# Altium schematic symbol library FPGA_Xilinx_Virtex7.SchLib: 34 symbols (part 23 of 26)
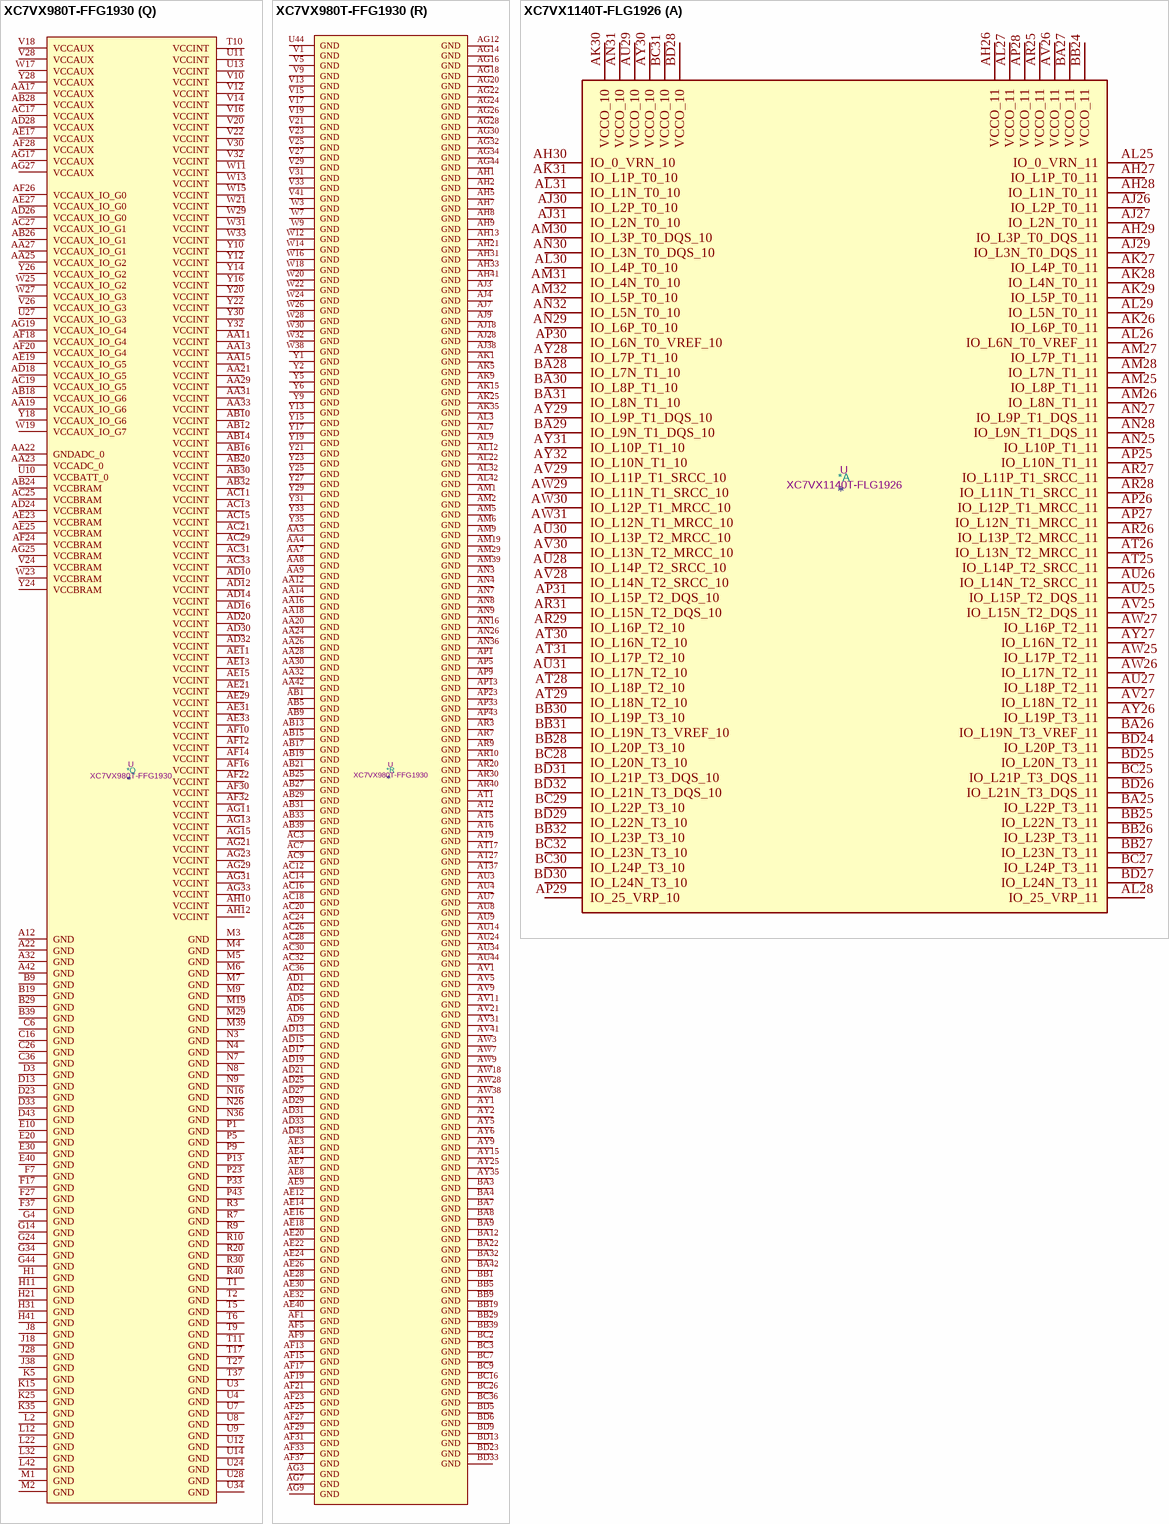
[diagram p194: symbols XC7VX980T-FFG1930 to XC7VX1140T-FLG1926]

## XC7VX980T-FFG1930
designator *  value XC7VX980T-FFG1930  Reference: U
ki_keywords: FPGA; ki_description: Virtex 7 XT 980 XC7VX980T-FFG1930
part A pins: AH29 IO_L4P_T0_10, AH30 IO_L4N_T0_10, AJ29 IO_0_VRN_10, AJ30 IO_L1P_T0_10, AJ31 IO_L1N_T0_10, AK29 IO_L2P_T0_10, AK30 VCCO_10, AK31 IO_L5P_T0_10, AL29 IO_L2N_T0_10, AL30 IO_L3P_T0_DQS_10, AL31 IO_L5N_T0_10, AM30 IO_L3N_T0_DQS_10, AM31 IO_25_VRP_10, AN29 IO_L6P_T0_10, AN30 IO_L6N_T0_VREF_10, AN31 VCCO_10, AP29 IO_L8P_T1_10, AP30 IO_L8N_T1_10, AP31 IO_L7P_T1_10, AR29 IO_L10P_T1_10, AR31 IO_L7N_T1_10, AT29 IO_L10N_T1_10, AT30 IO_L9P_T1_DQS_10, AT31 IO_L9N_T1_DQS_10, AU29 VCCO_10, AU30 IO_L11P_T1_SRCC_10, AU31 IO_L11N_T1_SRCC_10, AV29 IO_L12P_T1_MRCC_10, AV30 IO_L12N_T1_MRCC_10, AV32 IO_L13P_T2_MRCC_10, AW29 IO_L15P_T2_DQS_10, AW30 IO_L14P_T2_SRCC_10, AW31 IO_L14N_T2_SRCC_10, AW32 IO_L13N_T2_MRCC_10, AW33 VCCO_10, AW34 IO_0_VRN_11, AW41 IO_L7P_T1_11, AW42 IO_L6P_T0_11, AW43 VCCO_11, AW44 IO_L1P_T0_11, AY29 IO_L15N_T2_DQS_10, AY30 VCCO_10, AY31 IO_L16P_T2_10, AY32 IO_L16N_T2_10, AY33 IO_L24P_T3_11, AY34 IO_25_VRP_11, AY36 IO_L18P_T2_11, AY37 IO_L16P_T2_11, AY38 IO_L16N_T2_11, AY39 IO_L11P_T1_SRCC_11, AY40 VCCO_11, AY41 IO_L7N_T1_11, AY42 IO_L6N_T0_VREF_11, AY43 IO_L3P_T0_DQS_11, AY44 IO_L1N_T0_11, BA28 IO_L17P_T2_10, BA29 IO_L17N_T2_10, BA30 IO_L18P_T2_10, BA31 IO_L18N_T2_10, BA33 IO_L24N_T3_11, BA34 IO_L19P_T3_11, BA35 IO_L19N_T3_VREF_11, BA36 IO_L18N_T2_11, BA37 VCCO_11, BA38 IO_L13P_T2_MRCC_11, BA39 IO_L11N_T1_SRCC_11, BA40 IO_L9P_T1_DQS_11, BA41 IO_L9N_T1_DQS_11, BA43 IO_L5P_T0_11, BA44 IO_L3N_T0_DQS_11, BB28 IO_L24P_T3_10, BB30 IO_L22P_T3_10, BB31 IO_L19P_T3_10, BB32 IO_L19N_T3_VREF_10, BB33 IO_L22P_T3_11, BB34 VCCO_11, BB35 IO_L23P_T3_11, BB36 IO_L15P_T2_DQS_11, BB37 IO_L15N_T2_DQS_11, BB38 IO_L13N_T2_MRCC_11, BB40 IO_L8P_T1_11, BB41 IO_L8N_T1_11, BB42 IO_L4P_T0_11, BB43 IO_L5N_T0_11, BB44 VCCO_11, BC28 IO_L24N_T3_10, BC29 IO_L23P_T3_10, BC30 IO_L22N_T3_10, BC31 VCCO_10, BC32 IO_L20P_T3_10, BC33 IO_L22N_T3_11, BC34 IO_L20P_T3_11, BC35 IO_L23N_T3_11, BC37 IO_L17P_T2_11, BC38 IO_L14P_T2_SRCC_11, BC39 IO_L12P_T1_MRCC_11, BC40 IO_L10P_T1_11, BC41 VCCO_11, BC42 IO_L2P_T0_11, BC43 IO_L4N_T0_11, BD29 IO_L23N_T3_10, BD30 IO_L21P_T3_DQS_10, BD31 IO_L21N_T3_DQS_10, BD32 IO_L20N_T3_10, BD34 IO_L20N_T3_11, BD35 IO_L21P_T3_DQS_11, BD36 IO_L21N_T3_DQS_11, BD37 IO_L17N_T2_11, BD38 VCCO_11, BD39 IO_L14N_T2_SRCC_11, BD40 IO_L12N_T1_MRCC_11, BD41 IO_L10N_T1_11, BD42 IO_L2N_T0_11
part B pins: AH26 VCCO_12, AH27 IO_L2P_T0_12, AH28 IO_0_VRN_12, AJ25 IO_L3P_T0_DQS_12, AJ26 IO_L3N_T0_DQS_12, AJ27 IO_L2N_T0_12, AK26 IO_L4P_T0_12, AK27 IO_L4N_T0_12, AK28 IO_L1P_T0_12, AL25 IO_L5P_T0_12, AL26 IO_L6P_T0_12, AL27 VCCO_12, AL28 IO_L1N_T0_12, AM25 IO_L5N_T0_12, AM26 IO_L6N_T0_VREF_12, AM27 IO_25_VRP_12, AM28 IO_L7P_T1_12, AN25 IO_L8P_T1_12, AN27 IO_L9P_T1_DQS_12, AN28 IO_L7N_T1_12, AP25 IO_L8N_T1_12, AP26 IO_L10P_T1_12, AP27 IO_L9N_T1_DQS_12, AP28 VCCO_12, AP32 IO_L24P_T3_13, AP34 IO_L21P_T3_DQS_13, AP35 IO_0_VRN_13, AP36 IO_L15P_T2_DQS_13, AP38 VCCO_13, AR25 VCCO_12, AR26 IO_L10N_T1_12, AR27 IO_L11P_T1_SRCC_12, AR28 IO_L11N_T1_SRCC_12, AR32 IO_L24N_T3_13, AR33 IO_L23P_T3_13, AR34 IO_L21N_T3_DQS_13, AR35 VCCO_13, AR36 IO_L17P_T2_13, AR37 IO_L15N_T2_DQS_13, AR38 IO_L12P_T1_MRCC_13, AR39 IO_L7P_T1_13, AR41 IO_L6P_T0_13, AR42 IO_L5P_T0_13, AR43 IO_L5N_T0_13, AR44 IO_L1P_T0_13, AT25 IO_L12P_T1_MRCC_12, AT26 IO_L12N_T1_MRCC_12, AT28 IO_L13P_T2_MRCC_12, AT32 VCCO_13, AT33 IO_L23N_T3_13, AT34 IO_L19P_T3_13, AT35 IO_L19N_T3_VREF_13, AT36 IO_L17N_T2_13, AT38 IO_L11P_T1_SRCC_13, AT39 IO_L12N_T1_MRCC_13, AT40 IO_L7N_T1_13, AT41 IO_L6N_T0_VREF_13, AT42 VCCO_13, AT43 IO_L3P_T0_DQS_13, AT44 IO_L1N_T0_13, AU25 IO_L15P_T2_DQS_12, AU26 IO_L14P_T2_SRCC_12, AU27 IO_L14N_T2_SRCC_12, AU28 IO_L13N_T2_MRCC_12, AU32 IO_L20P_T3_13, AU33 IO_L20N_T3_13, AU35 IO_25_VRP_13, AU36 IO_L13P_T2_MRCC_13, AU37 IO_L13N_T2_MRCC_13, AU38 IO_L11N_T1_SRCC_13, AU39 VCCO_13, AU40 IO_L9P_T1_DQS_13, AU41 IO_L9N_T1_DQS_13, AU42 IO_L4P_T0_13, AU43 IO_L3N_T0_DQS_13, AV25 IO_L15N_T2_DQS_12, AV26 VCCO_12, AV27 IO_L18P_T2_12, AV28 IO_L18N_T2_12, AV33 IO_L22P_T3_13, AV34 IO_L22N_T3_13, AV35 IO_L16P_T2_13, AV36 VCCO_13, AV37 IO_L14P_T2_SRCC_13, AV38 IO_L14N_T2_SRCC_13, AV39 IO_L10P_T1_13, AV40 IO_L8P_T1_13, AV42 IO_L4N_T0_13, AV43 IO_L2P_T0_13, AV44 IO_L2N_T0_13, AW25 IO_L17P_T2_12, AW26 IO_L16P_T2_12, AW27 IO_L16N_T2_12, AW35 IO_L16N_T2_13, AW36 IO_L18P_T2_13, AW37 IO_L18N_T2_13, AW39 IO_L10N_T1_13, AW40 IO_L8N_T1_13, AY26 IO_L17N_T2_12, AY27 IO_L19P_T3_12, AY28 IO_L19N_T3_VREF_12, BA25 IO_L21P_T3_DQS_12, BA26 IO_L21N_T3_DQS_12, BA27 VCCO_12, BB25 IO_L20P_T3_12, BB26 IO_L20N_T3_12, BB27 IO_L22P_T3_12, BC25 IO_L23P_T3_12, BC27 IO_L22N_T3_12, BD25 IO_L23N_T3_12, BD26 IO_L24P_T3_12, BD27 IO_L24N_T3_12, BD28 VCCO_12
part C pins: AH22 IO_L2P_T0_D02_14, AH23 IO_L2N_T0_D03_14, AH24 IO_L1P_T0_D00_MOSI_14, AH25 IO_L1N_T0_D01_DIN_14, AH32 IO_L21P_T3_DQS_15, AJ21 IO_0_VRN_14, AJ22 IO_L6P_T0_FCS_B_14, AJ23 VCCO_14, AJ24 IO_L5P_T0_D06_14, AJ32 IO_L21N_T3_DQS_A18_15, AJ33 VCCO_15, AJ34 IO_L19P_T3_A22_15, AJ35 IO_0_VRN_15, AJ36 IO_L13P_T2_MRCC_15, AK21 IO_L4P_T0_D04_14, AK22 IO_L6N_T0_D08_VREF_14, AK23 IO_L3P_T0_DQS_PUDC_B_14, AK24 IO_L5N_T0_D07_14, AK32 IO_L20P_T3_A20_15, AK33 IO_L20N_T3_A19_15, AK34 IO_L19N_T3_A21_VREF_15, AK36 IO_L16P_T2_A28_15, AK37 IO_L13N_T2_MRCC_15, AK38 IO_L11P_T1_SRCC_15, AK39 IO_L9P_T1_DQS_AD3P_15, AK40 VCCO_15, AK41 IO_L6P_T0_15, AL21 IO_L4N_T0_D05_14, AL23 IO_L3N_T0_DQS_EMCCLK_14, AL24 IO_25_VRP_14, AL33 IO_L23P_T3_FOE_B_15, AL34 IO_L23N_T3_FWE_B_15, AL35 IO_L18P_T2_A24_15, AL36 IO_L16N_T2_A27_15, AL37 VCCO_15, AL38 IO_L11N_T1_SRCC_15, AL39 IO_L9N_T1_DQS_AD3N_15, AL40 IO_L7P_T1_AD2P_15, AL41 IO_L6N_T0_VREF_15, AL43 IO_L1P_T0_AD0P_15, AL44 IO_L1N_T0_AD0N_15, AM21 IO_L8P_T1_D11_14, AM22 IO_L8N_T1_D12_14, AM23 IO_L7P_T1_D09_14, AM24 VCCO_14, AM32 IO_L22P_T3_A17_15, AM33 IO_L22N_T3_A16_15, AM34 VCCO_15, AM35 IO_L17P_T2_A26_15, AM36 IO_L18N_T2_A23_15, AM37 IO_L14P_T2_SRCC_15, AM38 IO_L14N_T2_SRCC_15, AM40 IO_L7N_T1_AD2N_15, AM41 IO_L2P_T0_AD8P_15, AM42 IO_L2N_T0_AD8N_15, AM43 IO_L5P_T0_AD9P_15, AM44 VCCO_15, AN21 VCCO_14, AN22 IO_L10P_T1_D14_14, AN23 IO_L7N_T1_D10_14, AN24 IO_L9P_T1_DQS_14, AN32 IO_25_VRP_15, AN33 IO_L24P_T3_RS1_15, AN34 IO_L24N_T3_RS0_15, AN35 IO_L17N_T2_A25_15, AN37 IO_L15P_T2_DQS_15, AN38 IO_L12P_T1_MRCC_15, AN39 IO_L12N_T1_MRCC_15, AN40 IO_L8P_T1_AD10P_15, AN41 VCCO_15, AN42 IO_L4P_T0_15, AN43 IO_L5N_T0_AD9N_15, AN44 IO_L3P_T0_DQS_AD1P_15, AP21 IO_L12P_T1_MRCC_14, AP22 IO_L10N_T1_D15_14, AP24 IO_L9N_T1_DQS_D13_14, AP37 IO_L15N_T2_DQS_ADV_B_15, AP39 IO_L10P_T1_AD11P_15, AP40 IO_L10N_T1_AD11N_15, AP41 IO_L8N_T1_AD10N_15, AP42 IO_L4N_T0_15, AP44 IO_L3N_T0_DQS_AD1N_15, AR21 IO_L13P_T2_MRCC_14, AR22 IO_L12N_T1_MRCC_14, AR23 IO_L11P_T1_SRCC_14, AR24 IO_L11N_T1_SRCC_14, AT21 IO_L13N_T2_MRCC_14, AT22 VCCO_14, AT23 IO_L14P_T2_SRCC_14, AT24 IO_L14N_T2_SRCC_14, AU21 IO_L15P_T2_DQS_RDWR_B_14, AU22 IO_L15N_T2_DQS_DOUT_CSO_B_14, AU23 IO_L16P_T2_CSI_B_14, AV22 IO_L17P_T2_A14_D30_14, AV23 IO_L16N_T2_A15_D31_14, AV24 IO_L18P_T2_A12_D28_14, AW22 IO_L17N_T2_A13_D29_14, AW23 VCCO_14, AW24 IO_L18N_T2_A11_D27_14, AY22 IO_L19P_T3_A10_D26_14, AY23 IO_L19N_T3_A09_D25_VREF_14, AY24 IO_L20P_T3_A08_D24_14, BA23 IO_L22P_T3_A05_D21_14, BA24 IO_L20N_T3_A07_D23_14, BB22 IO_L23P_T3_A03_D19_14, BB23 IO_L22N_T3_A04_D20_14, BB24 VCCO_14, BC22 IO_L21P_T3_DQS_14, BC23 IO_L23N_T3_A02_D18_14, BC24 IO_L24P_T3_A01_D17_14, BD22 IO_L21N_T3_DQS_A06_D22_14, BD24 IO_L24N_T3_A00_D16_14
part D pins: AA34 IO_L22P_T3_17, AA35 IO_L21N_T3_DQS_17, AA36 IO_L19P_T3_17, AA37 VCCO_17, AA38 IO_L15N_T2_DQS_17, AA39 IO_L14P_T2_SRCC_17, AA40 IO_L14N_T2_SRCC_17, AA41 IO_L9N_T1_DQS_17, AA43 IO_L1P_T0_17, AA44 IO_L1N_T0_17, AB34 VCCO_17, AB35 IO_L21P_T3_DQS_17, AB36 IO_L23P_T3_17, AB37 IO_L23N_T3_17, AB38 IO_L15P_T2_DQS_17, AB40 IO_L12N_T1_MRCC_17, AB41 IO_L9P_T1_DQS_17, AB42 IO_L8N_T1_17, AB43 IO_L5N_T0_17, AB44 VCCO_17, AC34 IO_L24P_T3_17, AC35 IO_L24N_T3_17, AC37 IO_25_VRP_17, AC38 IO_L17P_T2_17, AC39 IO_L17N_T2_17, AC40 IO_L12P_T1_MRCC_17, AC41 VCCO_17, AC42 IO_L8P_T1_17, AC43 IO_L5P_T0_17, AC44 IO_L3N_T0_DQS_17, AD34 IO_L20P_T3_16, AD35 IO_L20N_T3_16, AD36 IO_L19P_T3_16, AD37 IO_0_VRN_16, AD38 VCCO_16, AD39 IO_L7P_T1_16, AD40 IO_L7N_T1_16, AD41 IO_L10P_T1_17, AD42 IO_L10N_T1_17, AD44 IO_L3P_T0_DQS_17, AE34 IO_L21P_T3_DQS_16, AE35 VCCO_16, AE36 IO_L22P_T3_16, AE37 IO_L19N_T3_VREF_16, AE38 IO_L16P_T2_16, AE39 IO_L16N_T2_16, AE41 IO_L9P_T1_DQS_16, AE42 IO_L9N_T1_DQS_16, AE43 IO_L5P_T0_16, AE44 IO_L3P_T0_DQS_16, AF34 IO_L21N_T3_DQS_16, AF35 IO_L23P_T3_16, AF36 IO_L22N_T3_16, AF38 IO_L18P_T2_16, AF39 IO_L13P_T2_MRCC_16, AF40 IO_L13N_T2_MRCC_16, AF41 IO_L8P_T1_16, AF42 VCCO_16, AF43 IO_L5N_T0_16, AF44 IO_L3N_T0_DQS_16, AG35 IO_L24P_T3_16, AG36 IO_L23N_T3_16, AG37 IO_L15P_T2_DQS_16, AG38 IO_L18N_T2_16, AG39 VCCO_16, AG40 IO_L11P_T1_SRCC_16, AG41 IO_L8N_T1_16, AG42 IO_L10P_T1_16, AG43 IO_L2P_T0_16, AH34 IO_25_VRP_16, AH35 IO_L24N_T3_16, AH36 VCCO_16, AH37 IO_L17P_T2_16, AH38 IO_L15N_T2_DQS_16, AH39 IO_L14P_T2_SRCC_16, AH40 IO_L11N_T1_SRCC_16, AH42 IO_L10N_T1_16, AH43 IO_L2N_T0_16, AH44 IO_L1P_T0_16, AJ37 IO_L17N_T2_16, AJ39 IO_L14N_T2_SRCC_16, AJ40 IO_L12P_T1_MRCC_16, AJ41 IO_L12N_T1_MRCC_16, AJ42 IO_L6P_T0_16, AJ43 VCCO_16, AJ44 IO_L1N_T0_16, AK42 IO_L6N_T0_VREF_16, AK43 IO_L4P_T0_16, AK44 IO_L4N_T0_16, V42 IO_L7N_T1_17, V43 IO_L2P_T0_17, V44 IO_L2N_T0_17, W34 IO_L20P_T3_17, W35 IO_L20N_T3_17, W36 IO_0_VRN_17, W37 IO_L16N_T2_17, W39 IO_L18N_T2_17, W40 IO_L13N_T2_MRCC_17, W41 IO_L11N_T1_SRCC_17, W42 IO_L7P_T1_17, W43 VCCO_17, W44 IO_L4N_T0_17, Y34 IO_L22N_T3_17, Y36 IO_L19N_T3_VREF_17, Y37 IO_L16P_T2_17, Y38 IO_L18P_T2_17, Y39 IO_L13P_T2_MRCC_17, Y40 VCCO_17, Y41 IO_L11P_T1_SRCC_17, Y42 IO_L6P_T0_17, Y43 IO_L6N_T0_VREF_17, Y44 IO_L4P_T0_17
part E pins: K40 VCCO_19, L37 VCCO_19, M34 VCCO_19, M44 VCCO_19, N31 VCCO_19, N41 VCCO_19, P35 IO_0_VRN_18, P36 IO_L8N_T1_18, P37 IO_L12N_T1_MRCC_18, P38 VCCO_18, P39 IO_L15P_T2_DQS_18, P40 IO_L15N_T2_DQS_18, P41 IO_L21P_T3_DQS_18, P42 IO_L21N_T3_DQS_18, P44 IO_L24N_T3_18, R31 IO_L2P_T0_18, R32 IO_L2N_T0_18, R33 IO_L4P_T0_18, R34 IO_L4N_T0_18, R35 VCCO_18, R36 IO_L8P_T1_18, R37 IO_L12P_T1_MRCC_18, R38 IO_L14P_T2_SRCC_18, R39 IO_L14N_T2_SRCC_18, R41 IO_L19N_T3_VREF_18, R42 IO_L23P_T3_18, R43 IO_L23N_T3_18, R44 IO_L24P_T3_18, T30 IO_L1P_T0_18, T31 IO_L1N_T0_18, T32 VCCO_18, T33 IO_L6P_T0_18, T34 IO_L6N_T0_VREF_18, T35 IO_L10P_T1_18, T36 IO_L10N_T1_18, T38 IO_L13N_T2_MRCC_18, T39 IO_L17P_T2_18, T40 IO_L17N_T2_18, T41 IO_L19P_T3_18, T42 VCCO_18, T43 IO_L22P_T3_18, T44 IO_L22N_T3_18, U30 IO_L3P_T0_DQS_18, U31 IO_L3N_T0_DQS_18, U32 IO_L5P_T0_18, U33 IO_L5N_T0_18, U35 IO_L9N_T1_DQS_18, U36 IO_L7P_T1_18, U37 IO_L7N_T1_18, U38 IO_L13P_T2_MRCC_18, U39 VCCO_18, U40 IO_L18P_T2_18, U41 IO_L18N_T2_18, U42 IO_L20P_T3_18, U43 IO_L20N_T3_18, V34 IO_25_VRP_18, V35 IO_L9P_T1_DQS_18, V36 VCCO_18, V37 IO_L11P_T1_SRCC_18, V38 IO_L11N_T1_SRCC_18, V39 IO_L16P_T2_18, V40 IO_L16N_T2_18
part F pins: A37 VCCO_21, B34 VCCO_21, C31 VCCO_21, C41 VCCO_21, D38 VCCO_21, E35 VCCO_20, F32 VCCO_20, F42 VCCO_21, G39 VCCO_20, H36 VCCO_20, J33 VCCO_20, J43 VCCO_20
part G pins: AH14 IO_0_VRN_31, AH15 IO_L4P_T0_31, AH16 VCCO_31, AH17 IO_25_VRP_30, AH18 IO_0_VRN_30, AH19 IO_L3P_T0_DQS_30, AH20 IO_L5P_T0_30, AJ14 IO_L1P_T0_31, AJ15 IO_L4N_T0_31, AJ16 IO_L2P_T0_31, AJ17 IO_L1P_T0_30, AJ19 IO_L3N_T0_DQS_30, AJ20 IO_L5N_T0_30, AK14 IO_L1N_T0_31, AK16 IO_L2N_T0_31, AK17 IO_L1N_T0_30, AK18 IO_L2P_T0_30, AK19 IO_L4P_T0_30, AK20 VCCO_30, AL14 IO_L3N_T0_DQS_31, AL15 IO_L3P_T0_DQS_31, AL16 IO_L5P_T0_31, AL17 VCCO_30, AL18 IO_L2N_T0_30, AL19 IO_L4N_T0_30, AL20 IO_L6P_T0_30, AM14 VCCO_31, AM15 IO_L6P_T0_31, AM16 IO_L5N_T0_31, AM17 IO_25_VRP_31, AM18 IO_L7P_T1_30, AM20 IO_L6N_T0_VREF_30, AN15 IO_L6N_T0_VREF_31, AN17 IO_L7N_T1_30, AN18 IO_L8N_T1_30, AN19 IO_L8P_T1_30, AN20 IO_L10P_T1_30, AP14 IO_L8N_T1_31, AP15 IO_L8P_T1_31, AP16 IO_L10P_T1_31, AP17 IO_L7P_T1_31, AP18 VCCO_30, AP19 IO_L9P_T1_DQS_30, AP20 IO_L10N_T1_30, AR14 IO_L9P_T1_DQS_31, AR15 VCCO_31, AR16 IO_L10N_T1_31, AR17 IO_L7N_T1_31, AR18 IO_L9N_T1_DQS_30, AR19 IO_L12P_T1_MRCC_30, AT14 IO_L9N_T1_DQS_31, AT15 IO_L11P_T1_SRCC_31, AT16 IO_L12P_T1_MRCC_31, AT18 IO_L12N_T1_MRCC_30, AT19 IO_L11N_T1_SRCC_30, AT20 IO_L11P_T1_SRCC_30, AU15 IO_L11N_T1_SRCC_31, AU16 IO_L12N_T1_MRCC_31, AU17 IO_L14P_T2_SRCC_31, AU18 IO_L14P_T2_SRCC_30, AU19 VCCO_30, AU20 IO_L13P_T2_MRCC_30, AV14 IO_L13N_T2_MRCC_31, AV15 IO_L13P_T2_MRCC_31, AV16 VCCO_31, AV17 IO_L14N_T2_SRCC_31, AV18 IO_L14N_T2_SRCC_30, AV19 IO_L15P_T2_DQS_30, AV20 IO_L13N_T2_MRCC_30, AW14 IO_L15P_T2_DQS_31, AW15 IO_L17N_T2_31, AW16 IO_L17P_T2_31, AW17 IO_L18P_T2_31, AW19 IO_L15N_T2_DQS_30, AW20 IO_L18P_T2_30, AW21 IO_L16P_T2_30, AY14 IO_L15N_T2_DQS_31, AY16 IO_L16P_T2_31, AY17 IO_L18N_T2_31, AY18 IO_L17P_T2_30, AY19 IO_L18N_T2_30, AY20 VCCO_30, AY21 IO_L16N_T2_30, BA14 IO_L19N_T3_VREF_31, BA15 IO_L19P_T3_31, BA16 IO_L16N_T2_31, BA17 VCCO_31, BA18 IO_L17N_T2_30, BA19 IO_L19N_T3_VREF_30, BA20 IO_L19P_T3_30, BA21 IO_L20P_T3_30, BB14 VCCO_31, BB15 IO_L20N_T3_31, BB16 IO_L20P_T3_31, BB17 IO_L23P_T3_31, BB18 IO_L23P_T3_30, BB20 IO_L22P_T3_30, BB21 IO_L20N_T3_30, BC14 IO_L22N_T3_31, BC15 IO_L22P_T3_31, BC17 IO_L23N_T3_31, BC18 IO_L23N_T3_30, BC19 IO_L21P_T3_DQS_30, BC20 IO_L22N_T3_30, BC21 VCCO_30, BD14 IO_L21N_T3_DQS_31, BD15 IO_L21P_T3_DQS_31, BD16 IO_L24N_T3_31, BD17 IO_L24P_T3_31, BD18 VCCO_30, BD19 IO_L21N_T3_DQS_30, BD20 IO_L24N_T3_30, BD21 IO_L24P_T3_30
part H pins: A27 VCCO_33, A28 IO_L20P_T3_33, A29 IO_L20N_T3_33, A30 IO_L24N_T3_33, AJ12 IO_L1P_T0_32, AJ13 VCCO_32, AK11 IO_0_VRN_32, AK12 IO_L1N_T0_32, AK13 IO_L2P_T0_32, AL10 IO_L4N_T0_32, AL11 IO_L4P_T0_32, AL13 IO_L2N_T0_32, AM10 IO_L6N_T0_VREF_32, AM11 IO_L6P_T0_32, AM12 IO_L3P_T0_DQS_32, AM13 IO_L5P_T0_32, AN10 IO_L8P_T1_32, AN11 VCCO_32, AN12 IO_L3N_T0_DQS_32, AN13 IO_L5N_T0_32, AN14 IO_25_VRP_32, AP10 IO_L8N_T1_32, AP11 IO_L10P_T1_32, AP12 IO_L7P_T1_32, AR11 IO_L10N_T1_32, AR12 IO_L7N_T1_32, AR13 IO_L9P_T1_DQS_32, AT10 IO_L12N_T1_MRCC_32, AT11 IO_L12P_T1_MRCC_32, AT12 VCCO_32, AT13 IO_L9N_T1_DQS_32, AU10 IO_L13N_T2_MRCC_32, AU11 IO_L13P_T2_MRCC_32, AU12 IO_L11N_T1_SRCC_32, AU13 IO_L11P_T1_SRCC_32, AV10 IO_L15P_T2_DQS_32, AV12 IO_L14N_T2_SRCC_32, AV13 IO_L14P_T2_SRCC_32, AW10 IO_L15N_T2_DQS_32, AW11 IO_L17P_T2_32, AW12 IO_L16P_T2_32, AW13 VCCO_32, AY10 VCCO_32, AY11 IO_L17N_T2_32, AY12 IO_L16N_T2_32, AY13 IO_L18P_T2_32, B27 IO_L23P_T3_33, B28 IO_L23N_T3_33, B30 IO_L24P_T3_33, BA10 IO_L19N_T3_VREF_32, BA11 IO_L19P_T3_32, BA13 IO_L18N_T2_32, BB10 IO_L21N_T3_DQS_32, BB11 IO_L21P_T3_DQS_32, BB12 IO_L20N_T3_32, BB13 IO_L20P_T3_32, BC10 IO_L23P_T3_32, BC11 VCCO_32, BC12 IO_L22N_T3_32, BC13 IO_L22P_T3_32, BD10 IO_L23N_T3_32, BD11 IO_L24N_T3_32, BD12 IO_L24P_T3_32, C27 IO_L21P_T3_DQS_33, C28 IO_L21N_T3_DQS_33, C29 IO_L22P_T3_33, C30 IO_L22N_T3_33, D27 IO_L15N_T2_DQS_33, D28 VCCO_33, D29 IO_L19P_T3_33, D30 IO_L19N_T3_VREF_33, E27 IO_L15P_T2_DQS_33, E28 IO_L17N_T2_33, E29 IO_L16N_T2_33, F28 IO_L17P_T2_33, F29 IO_L16P_T2_33, F30 IO_L18N_T2_33, G27 IO_L14P_T2_SRCC_33, G28 IO_L14N_T2_SRCC_33, G29 VCCO_33, G30 IO_L18P_T2_33, H27 IO_L13P_T2_MRCC_33, H28 IO_L13N_T2_MRCC_33, H29 IO_L12P_T1_MRCC_33, H30 IO_L12N_T1_MRCC_33, J27 IO_L10N_T1_33, J29 IO_L11P_T1_SRCC_33, J30 IO_L11N_T1_SRCC_33, K27 IO_L10P_T1_33, K28 IO_L8N_T1_33, K29 IO_L9N_T1_DQS_33, K30 VCCO_33, L27 VCCO_33, L28 IO_L8P_T1_33, L29 IO_L9P_T1_DQS_33, M27 IO_L7P_T1_33, M28 IO_L7N_T1_33, N27 IO_L5P_T0_33, N28 IO_L5N_T0_33, N29 IO_25_VRP_33, P26 IO_L4P_T0_33, P27 IO_L4N_T0_33, P28 VCCO_33, P29 IO_L3N_T0_DQS_33, R26 IO_L2N_T0_33, R27 IO_L6P_T0_33, R28 IO_L6N_T0_VREF_33, R29 IO_L3P_T0_DQS_33, T26 IO_L2P_T0_33, T28 IO_L1P_T0_33, T29 IO_L1N_T0_33, U26 IO_0_VRN_33, U29 VCCO_33
part I pins: A20 IO_L24N_T3_35, A21 IO_L24P_T3_35, A23 IO_L23N_T3_35, A24 IO_L21P_T3_DQS_34, A25 IO_L21N_T3_DQS_34, A26 IO_L23N_T3_34, B20 IO_L20N_T3_35, B21 IO_L22N_T3_35, B22 IO_L21N_T3_DQS_35, B23 IO_L23P_T3_35, B24 VCCO_34, B25 IO_L24N_T3_34, B26 IO_L23P_T3_34, C20 IO_L20P_T3_35, C21 VCCO_35, C22 IO_L22P_T3_35, C23 IO_L21P_T3_DQS_35, C24 IO_L24P_T3_34, C25 IO_L22N_T3_34, D20 IO_L19N_T3_VREF_35, D21 IO_L19P_T3_35, D22 IO_L18N_T2_35, D24 IO_L20N_T3_34, D25 IO_L22P_T3_34, D26 IO_L19N_T3_VREF_34, E21 IO_L16N_T2_35, E22 IO_L16P_T2_35, E23 IO_L18P_T2_35, E24 IO_L20P_T3_34, E25 VCCO_34, E26 IO_L19P_T3_34, F20 IO_L15N_T2_DQS_35, F21 IO_L17N_T2_35, F22 VCCO_35, F23 IO_L17N_T2_34, F24 IO_L16P_T2_34, F25 IO_L16N_T2_34, F26 IO_L18N_T2_34, G20 IO_L15P_T2_DQS_35, G21 IO_L17P_T2_35, G22 IO_L14N_T2_SRCC_35, G23 IO_L17P_T2_34, G25 IO_L15N_T2_DQS_34, G26 IO_L18P_T2_34, H20 IO_L13N_T2_MRCC_35, H22 IO_L14P_T2_SRCC_35, H23 IO_L13P_T2_MRCC_34, H24 IO_L13N_T2_MRCC_34, H25 IO_L15P_T2_DQS_34, H26 VCCO_34, J20 IO_L13P_T2_MRCC_35, J21 IO_L12N_T1_MRCC_35, J22 IO_L11N_T1_SRCC_35, J23 VCCO_34, J24 IO_L12N_T1_MRCC_34, J25 IO_L14P_T2_SRCC_34, J26 IO_L14N_T2_SRCC_34, K20 VCCO_35, K21 IO_L12P_T1_MRCC_35, K22 IO_L11P_T1_SRCC_35, K23 IO_L10N_T1_34, K24 IO_L12P_T1_MRCC_34, K26 IO_L11N_T1_SRCC_34, L19 IO_L9N_T1_DQS_AD7N_35, L20 IO_L9P_T1_DQS_AD7P_35, L21 IO_L10N_T1_AD15N_35, L23 IO_L10P_T1_34, L24 IO_L7P_T1_34, L25 IO_L7N_T1_34, L26 IO_L11P_T1_SRCC_34, M20 IO_L8N_T1_AD14N_35, M21 IO_L10P_T1_AD15P_35, M22 IO_L7N_T1_AD6N_35, M23 IO_L8N_T1_34, M24 VCCO_34, M25 IO_L9P_T1_DQS_34, M26 IO_L9N_T1_DQS_34, N19 IO_L6N_T0_VREF_35, N20 IO_L8P_T1_AD14P_35, N21 VCCO_35, N22 IO_L7P_T1_AD6P_35, N23 IO_L8P_T1_34, N24 IO_L1N_T0_34, N25 IO_25_VRP_34, P18 VCCO_35, P19 IO_L4N_T0_35, P20 IO_L6P_T0_35, P21 IO_25_VRP_35, P22 IO_L4N_T0_34, P24 IO_L1P_T0_34, P25 IO_L3N_T0_DQS_34, R18 IO_L2N_T0_AD12N_35, R19 IO_L4P_T0_35, R21 IO_L5N_T0_AD13N_35, R22 IO_L4P_T0_34, R23 IO_L2N_T0_34, R24 IO_L3P_T0_DQS_34, R25 VCCO_34, T18 IO_L2P_T0_AD12P_35, T19 IO_L1N_T0_AD4N_35, T20 IO_L1P_T0_AD4P_35, T21 IO_L5P_T0_AD13P_35, T22 VCCO_34, T23 IO_L2P_T0_34, T24 IO_L6N_T0_VREF_34, T25 IO_L5N_T0_34, U18 IO_0_VRN_35, U19 VCCO_35, U20 IO_L3N_T0_DQS_AD5N_35, U21 IO_L3P_T0_DQS_AD5P_35, U22 IO_0_VRN_34, U23 IO_L6P_T0_34, U25 IO_L5P_T0_34
part J pins: A3 IO_L1N_T0_36, A4 IO_L1P_T0_36, A5 IO_L4N_T0_36, A6 IO_L2N_T0_36, A7 VCCO_37, A8 IO_L2N_T0_37, A9 IO_L2P_T0_37, A10 IO_L3N_T0_DQS_37, A11 IO_L1N_T0_37, B2 IO_L5N_T0_36, B3 IO_L3N_T0_DQS_36, B4 VCCO_36, B5 IO_L4P_T0_36, B6 IO_L2P_T0_36, B7 IO_L4N_T0_37, B8 IO_L4P_T0_37, B10 IO_L3P_T0_DQS_37, B11 IO_L1P_T0_37, C1 VCCO_36, C2 IO_L5P_T0_36, C3 IO_L3P_T0_DQS_36, C4 IO_L6N_T0_VREF_36, C5 IO_L6P_T0_36, C7 IO_L6N_T0_VREF_37, C8 IO_L6P_T0_37, C9 IO_L5N_T0_37, C10 IO_L5P_T0_37, C11 VCCO_37, D1 IO_L7N_T1_36, D2 IO_L7P_T1_36, D4 IO_L10N_T1_36, D5 IO_L8N_T1_36, D6 IO_L10N_T1_37, D7 IO_L10P_T1_37, D8 VCCO_37, D9 IO_L9N_T1_DQS_37, D10 IO_L9P_T1_DQS_37, D11 IO_L7N_T1_37, E1 IO_L9N_T1_DQS_36, E2 IO_L12N_T1_MRCC_36, E3 IO_L12P_T1_MRCC_36, E4 IO_L10P_T1_36, E5 VCCO_36, E6 IO_L8P_T1_36, E7 IO_L12N_T1_MRCC_37, E8 IO_L8N_T1_37, E9 IO_L8P_T1_37, E11 IO_L7P_T1_37, F1 IO_L9P_T1_DQS_36, F2 VCCO_36, F3 IO_L11N_T1_SRCC_36, F4 IO_L11P_T1_SRCC_36, F5 IO_L13N_T2_MRCC_36, F6 IO_L13P_T2_MRCC_36, F8 IO_L12P_T1_MRCC_37, F9 IO_L11N_T1_SRCC_37, F10 IO_L11P_T1_SRCC_37, F11 IO_L13N_T2_MRCC_37, G1 IO_L18N_T2_36, G2 IO_L14N_T2_SRCC_36, G3 IO_L14P_T2_SRCC_36, G5 IO_L15N_T2_DQS_36, G6 IO_L15P_T2_DQS_36, G7 IO_L14N_T2_SRCC_37, G8 IO_L14P_T2_SRCC_37, G9 VCCO_37, G10 IO_L16N_T2_37, G11 IO_L13P_T2_MRCC_37, H2 IO_L18P_T2_36, H3 IO_L16N_T2_36, H4 IO_L16P_T2_36, H5 IO_L17N_T2_36, H6 VCCO_36, H7 IO_L17N_T2_37, H8 IO_L17P_T2_37, H9 IO_L15N_T2_DQS_37, H10 IO_L16P_T2_37, J1 IO_L20N_T3_36, J2 IO_L20P_T3_36, J3 VCCO_36, J4 IO_L19N_T3_VREF_36, J5 IO_L19P_T3_36, J6 IO_L17P_T2_36, J7 IO_L20N_T3_37, J9 IO_L15P_T2_DQS_37, J10 IO_L18N_T2_37, J11 IO_L18P_T2_37, K1 IO_L22N_T3_36, K2 IO_L23N_T3_36, K3 IO_L21N_T3_DQS_36, K4 IO_L21P_T3_DQS_36, K6 IO_0_VRN_36, K7 IO_L20P_T3_37, K8 IO_L19N_T3_VREF_37, K9 IO_L19P_T3_37, K10 VCCO_37, K11 IO_0_VRN_37, L1 IO_L22P_T3_36, L3 IO_L23P_T3_36, L4 IO_25_VRP_36, L5 IO_L24N_T3_36, L6 IO_L24P_T3_36, L7 VCCO_37, L8 IO_L22N_T3_37, L9 IO_L22P_T3_37, L10 IO_L21N_T3_DQS_37, L11 IO_L21P_T3_DQS_37, M8 IO_25_VRP_37, M10 IO_L23N_T3_37, M11 IO_L23P_T3_37, N10 IO_L24N_T3_37, N11 VCCO_37, P10 IO_L24P_T3_37
part K pins: A13 IO_L3N_T0_DQS_38, A14 IO_L3P_T0_DQS_38, A17 VCCO_39, B12 IO_L2N_T0_38, B13 IO_L5N_T0_38, B14 VCCO_38, C12 IO_L2P_T0_38, C13 IO_L5P_T0_38, C14 IO_L1N_T0_38, D12 IO_L4N_T0_38, D14 IO_L1P_T0_38, D18 VCCO_39, E12 IO_L4P_T0_38, E13 IO_L6N_T0_VREF_38, E14 IO_L6P_T0_38, E15 VCCO_38, F12 VCCO_38, F13 IO_L9N_T1_DQS_38, F14 IO_L9P_T1_DQS_38, F15 IO_L7N_T1_38, G12 IO_L8N_T1_38, G13 IO_L8P_T1_38, G15 IO_L7P_T1_38, G19 VCCO_39, H12 IO_L11N_T1_SRCC_38, H13 IO_L11P_T1_SRCC_38, H14 IO_L10N_T1_38, H15 IO_L10P_T1_38, H16 VCCO_39, J12 IO_L14N_T2_SRCC_38, J13 VCCO_38, J14 IO_L12N_T1_MRCC_38, J15 IO_L12P_T1_MRCC_38, K12 IO_L14P_T2_SRCC_38, K13 IO_L13N_T2_MRCC_38, K14 IO_L13P_T2_MRCC_38, L13 IO_L16N_T2_38, L14 IO_L16P_T2_38, L15 IO_L15N_T2_DQS_38, L17 VCCO_39, M12 IO_L18N_T2_38, M13 IO_L18P_T2_38, M14 VCCO_38, M15 IO_L15P_T2_DQS_38, N12 IO_L19N_T3_VREF_38, N13 IO_L19P_T3_38, N14 IO_L17N_T2_38, N15 IO_L17P_T2_38, P11 IO_L20N_T3_38, P12 IO_L20P_T3_38, P14 IO_L21N_T3_DQS_38, P15 IO_0_VRN_38, R11 IO_25_VRP_38, R12 IO_L22N_T3_38, R13 IO_L22P_T3_38, R14 IO_L21P_T3_DQS_38, R15 VCCO_39, T12 VCCO_38, T13 IO_L23N_T3_38, T14 IO_L23P_T3_38, T15 IO_L24N_T3_38, U15 IO_L24P_T3_38
part L pins: AP3 MGTHTXN3_114, AP4 MGTHTXP3_114, AR1 MGTHTXN2_114, AR2 MGTHTXP2_114, AR5 MGTHRXN3_114, AR6 MGTHRXP3_114, AT3 MGTHRXN2_114, AT4 MGTHRXP2_114, AT7 MGTREFCLK0N_114, AT8 MGTREFCLK0P_114, AU1 MGTHTXN1_114, AU2 MGTHTXP1_114, AU5 MGTHRXN1_114, AU6 MGTHRXP1_114, AV3 MGTHTXN0_114, AV4 MGTHTXP0_114, AV7 MGTREFCLK1N_114, AV8 MGTREFCLK1P_114, AW1 MGTHTXN3_113, AW2 MGTHTXP3_113, AW5 MGTHRXN0_114, AW6 MGTHRXP0_114, AY3 MGTHRXN3_113, AY4 MGTHRXP3_113, AY7 MGTREFCLK0N_113, AY8 MGTREFCLK0P_113, BA1 MGTHTXN2_113, BA2 MGTHTXP2_113, BA5 MGTHRXN2_113, BA6 MGTHRXP2_113, BB3 MGTHTXN1_113, BB4 MGTHTXP1_113, BB7 MGTREFCLK1N_113, BB8 MGTREFCLK1P_113, BC5 MGTHRXN1_113, BC6 MGTHRXP1_113, BD3 MGTHTXN0_113, BD4 MGTHTXP0_113, BD7 MGTHRXN0_113, BD8 MGTHRXP0_113